# Altium footprint library STM32F0.PcbLib: 228 footprints (part 2 of 16)
Each footprint in its own frame and in the unit in brackets; x right, y up, seen from the top. Pads: shape width x height; smd on the part's side, far side on the other; paste and mask are expansions set on the pad; w line width, h text height; cw(c..) or ccw(c..) is an arc to the next point about the centre after c.
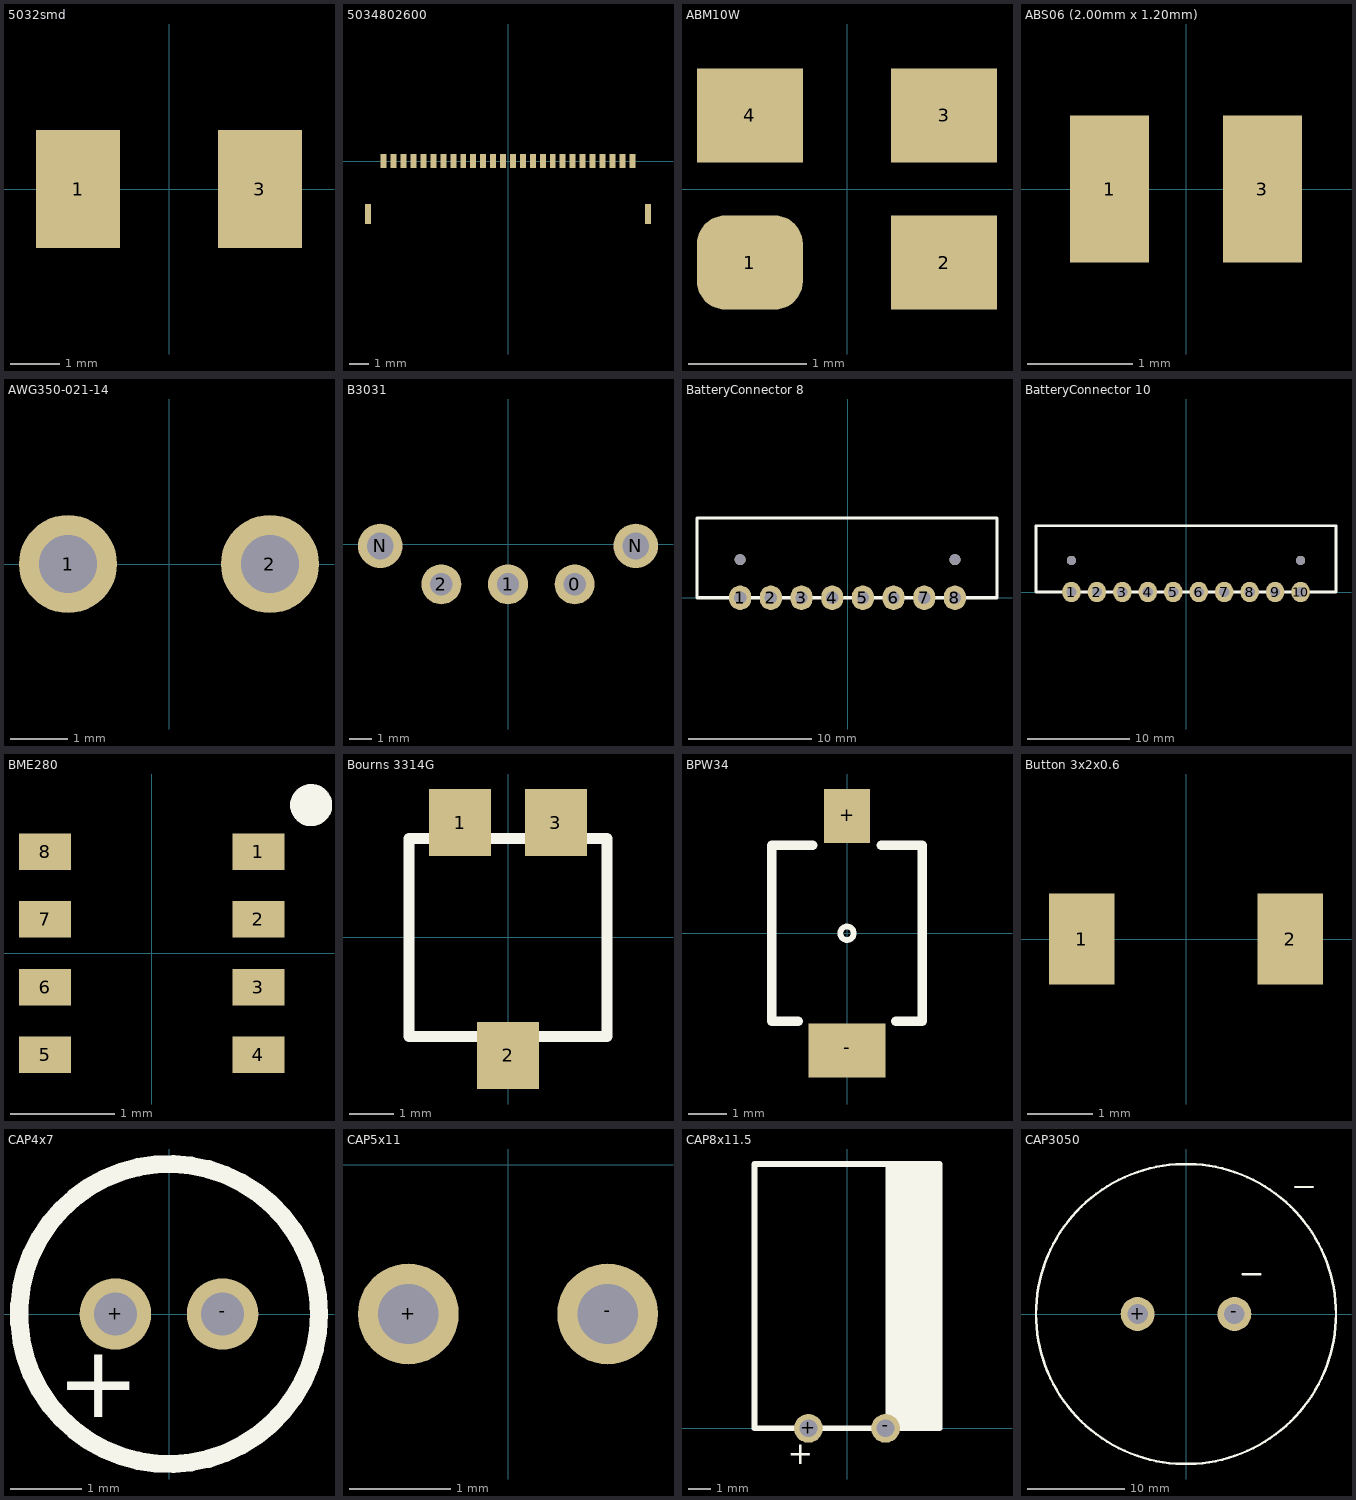
[diagram p1: the footprints below, top view; thin cyan lines are the x and y axes]

## 5032smd [mm]
pads (2):
  rect 1.7x2.4 smd: 1(-1.85,0) 3(1.85,0)
3D body "User Library-ABM3-1.STEP": height 1.3, standoff 0, extent -2.5,-1.6 2.5,1.6

## 5034802600 [mm]
pads (28):
  rect 0.3x0.7 smd: 1(-6.25,0) 2(-5.75,0) 3(-5.25,0) 4(-4.75,0) 5(-4.25,0) 6(-3.75,0) 7(-3.25,0) 8(-2.75,0) 9(-2.25,0) 10(-1.75,0) 11(-1.25,0) 12(-0.75,0) 13(-0.25,0) 14(0.25,0) 15(0.75,0) 16(1.25,0) 17(1.75,0) 18(2.25,0) 19(2.75,0) 20(3.25,0) 21(3.75,0) 22(4.25,0) 23(4.75,0) 24(5.25,0) 25(5.75,0) 26(6.25,0)
  rect 0.3x1 smd: M(-7.04,-2.65) M(7.04,-2.65)
3D body "503480-2600.step": height 1.87, standoff -0.02, extent -7.35,-3.3 7.35,0.3

## ABM10W [mm]
pads (4):
  rrect60% 0.9x0.8 smd: 1(-0.825,-0.625)
  rect 0.9x0.8 smd: 2(0.825,-0.625) 3(0.825,0.625) 4(-0.825,0.625)
3D body "User Library-ABM10_Xtal.step": height 0.7, standoff -0.01, extent -1.295,-1.045 1.305,1.055

## ABS06 (2.00mm x 1.20mm) [mm]
pads (2):
  rect 0.75x1.4 smd: 1(-0.725,0) 3(0.725,0)
3D body "User Library-ABS06.STEP": height 0.6, standoff 0, extent -1,-0.61 1,0.61

## AWG350-021-14 [mm]
pads (2):
  round 1.7 hole 1: 1(-1.75,0) 2(1.75,0)
3D body "User Library-DG350-3,5-02P.step": height 8.4, standoff -3.4, extent -4.002,-3.402 3.998,3.398

## B3031 [mm]
pads (5):
  round 1.8 hole 1: 0(3,-1.8) 1(0,-1.8) 2(-3,-1.8)
  round 2 hole 1.2: N(-5.75,-0.075) N(5.75,-0.075)
3D body "B3031.stp": height 5.8, standoff -2, extent -6.15,-2.075 6.25,9.41

## BatteryConnector 8 [mm]
pads (10):
  oval 1.8x2 hole 1: 1(-8.75,0) 2(-6.25,0) 3(-3.75,0) 4(-1.25,0) 5(1.25,0) 6(3.75,0) 7(6.25,0) 8(8.75,0)
  round 0.9 hole 0.9 unplated: ""(-8.75,3.1) ""(8.75,3.1)
Top Overlay:
  lines w0.254: -12.27,0 12.18,0 12.18,6.5 -12.27,6.5 -12.27,0
3D body "BatteryConnector8.STEP": height 5.52, standoff -2.2, extent -12.225,0 12.225,6.5

## BatteryConnector 10 [mm]
pads (12):
  oval 1.8x2 hole 1: 1(-11.25,0) 2(-8.75,0) 3(-6.25,0) 4(-3.75,0) 5(-1.25,0) 6(1.25,0) 7(3.75,0) 8(6.25,0) 9(8.75,0) 10(11.25,0)
  round 0.9 hole 0.9 unplated: ""(-11.25,3.1) ""(11.25,3.1)
Top Overlay:
  lines w0.254: -14.725,0 14.725,0 14.725,6.5 -14.725,6.5 -14.725,0
3D body "BatteryConnector10.STEP": height 5.52, standoff -2.2, extent -14.725,0 14.725,6.5

## BME280 [mm]
pads (8):
  rect 0.5x0.35 smd: 1(1.025,0.975) 2(1.025,0.325) 3(1.025,-0.325) 4(1.025,-0.975) 5(-1.025,-0.975) 6(-1.025,-0.325) 7(-1.025,0.325) 8(-1.025,0.975)
Top Overlay:
  circle w0.254: c1.533,1.424 r0.075
3D body "User Library-Bosch_BME280.step": height 0.93, standoff 0, extent -1.25,-1.25 1.25,1.25

## Bourns 3314G [mm]
pads (3):
  rect 1.4x1.524 smd: 1(-1.09,2.61) 2(0,-2.68) 3(1.09,2.61)
Top Overlay:
  lines w0.254: -2.25,-2.25 2.25,-2.25 2.25,2.25 -2.25,2.25 -2.25,-2.25
3D body "3314g-2-101e.stp": height 2.7, standoff -0.02, extent -2.5,-3.099 2.5,3.099

## BPW34 [mm]
pads (2):
  rect 1.2x1.4 smd: +(0,3.05)
  rect 2x1.4 smd: -(0,-3.05)
Top Overlay:
  circle w0.15: c0,0 r0.175
  lines w0.254: -1.27,-2.286 -1.956,-2.286 -1.956,2.286 -0.889,2.286 ; 0.889,2.286 1.956,2.286 1.956,-2.286 1.27,-2.286
3D body "User Library-bpw34s.step": height 1.12, standoff -0.1, extent -1.95,-3.203 1.95,3.203

## Button 3x2x0.6 [mm]
pads (2):
  rect 1x1.4 smd: 1(-1.6,0) 2(1.6,0)
3D body "Button(2x3x0.6mm).step": height 0.6, standoff 0, extent -1.75,-1 1.75,1

## CAP4x7 [mm]
pads (2):
  round 1 hole 0.6: +(-0.75,0) -(0.75,0)
Top Overlay:
  circle w0.254: c0,0 r2.1
  text "+" at -1.57,-1.447 h1.02
3D body "User Library-Cap electrolitic radial 4x7.STEP": height 7.1, standoff -1.4, extent -1.966,-2.016 2.032,1.982

## CAP5x11 [mm]
pads (2):
  round 1 hole 0.6: +(-0.994,-1.48) -(0.984,-1.48)
3D body "User Library-Cap electro 5x11x2mm RA.step": height 5.03, standoff -3.5, extent -2.525,-1.795 2.525,11.526

## CAP8x11.5 [mm]
pads (2):
  round 1.3 hole 0.8: +(-1.75,0) -(1.75,0)
Top Overlay:
  rectangle: 1.75,0 4.2,12
  lines w0.254: 4.186,12 -4.2,12 -4.2,0 0,0 4.2,0 4.2,12
  text "+" at -2.699,-1.615 h1.02
3D body "User Library-Cap electro 8x11_5x3_5mm RA.step": height 8.13, standoff -1.9, extent -4.068,-0.735 3.982,13.086

## CAP3050 [mm]
pads (2):
  round 3.5 hole 2.1: +(-5,0) -(5,0)
Top Overlay:
  circle w0.254: c0,0 r15.5
  lines w0.254: 5.875,4.1 7.65,4.1 ; 11.3,13.125 13.075,13.125